# Altium footprint library DM2097_R1M1E1.PcbLib: 70 footprints (part 3 of 5)
Each footprint in its own frame and in the unit in brackets; x right, y up, seen from the top. Pads: shape width x height; smd on the part's side, far side on the other; paste and mask are expansions set on the pad; w line width, h text height; cw(c..) or ccw(c..) is an arc to the next point about the centre after c.
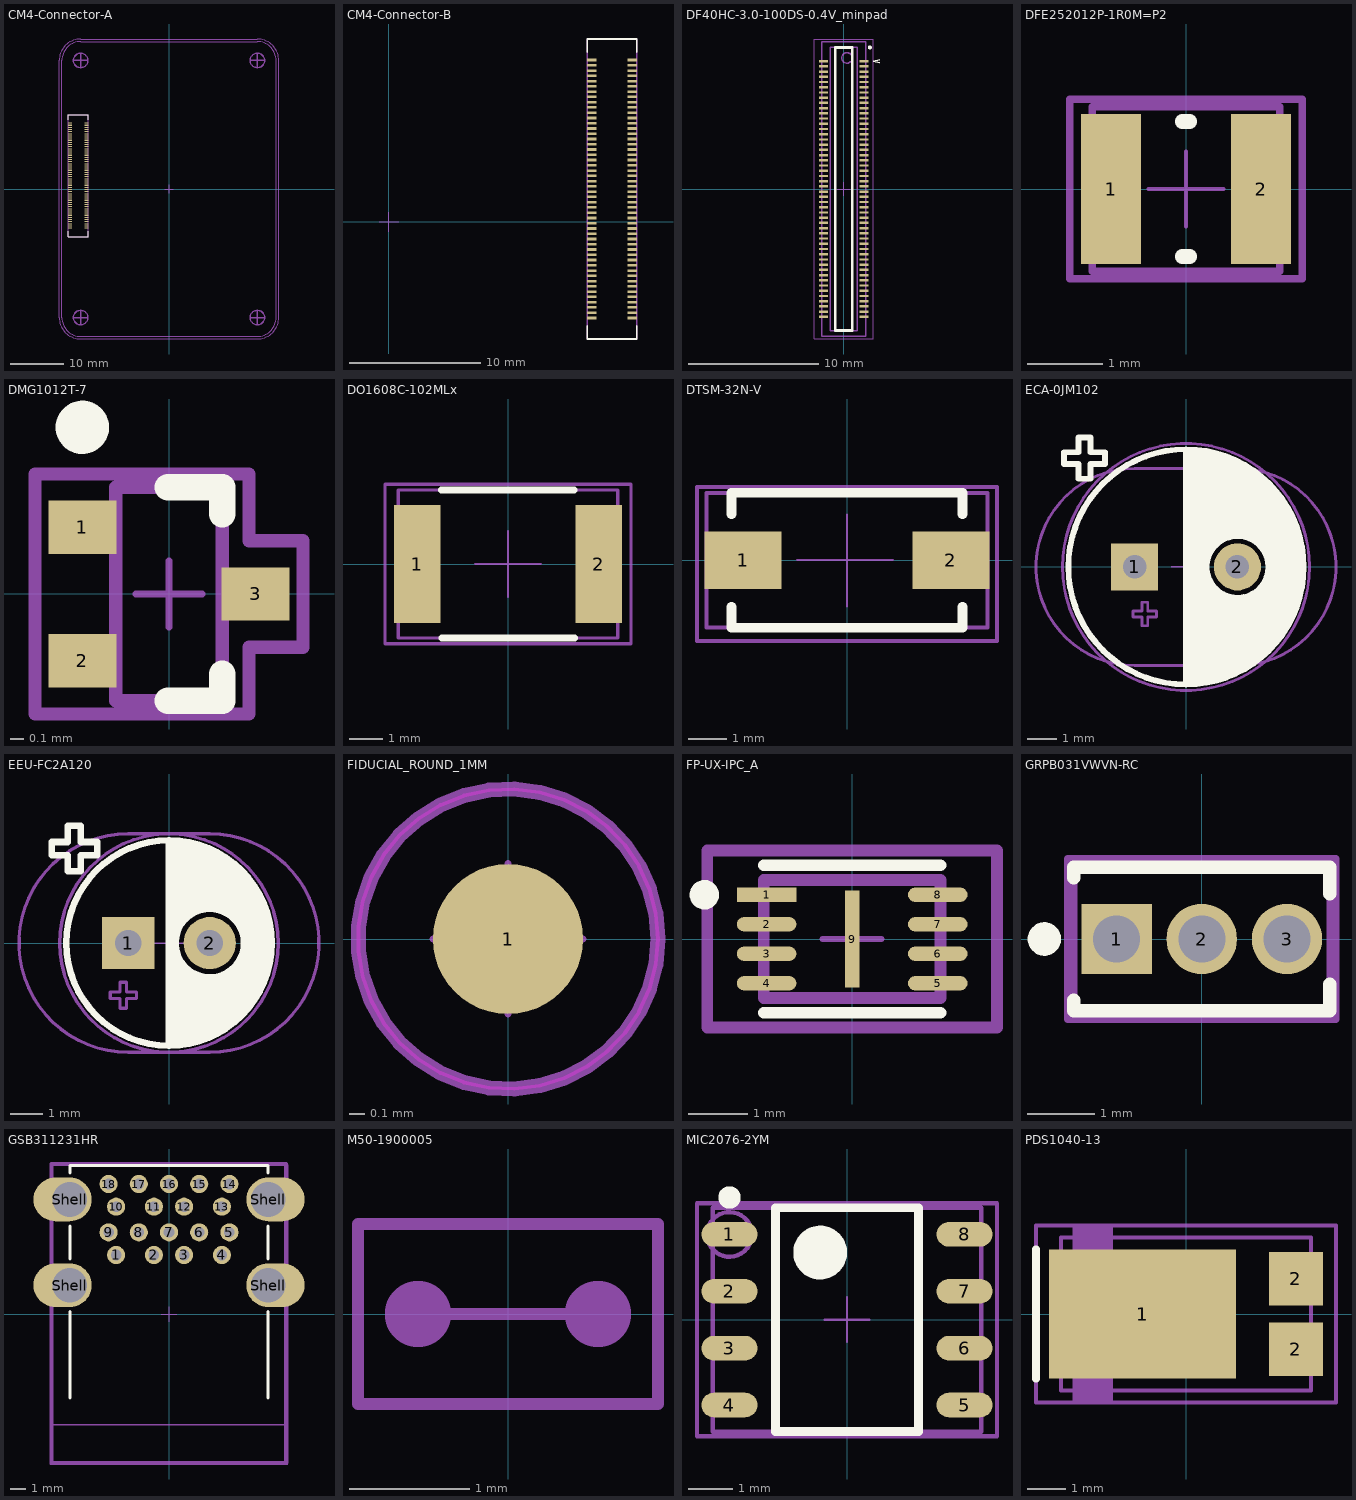
[diagram p2: the footprints below, top view; thin cyan lines are the x and y axes]

## CM4-Connector-A [mm] "DF40HC(3.0)-100DS-0.4v by Amornthep Phunsin"
pads (100):
  rect 0.7x0.2 smd: 1(-15.42,-7.3) 2(-18.5,-7.3) 3(-15.42,-6.9) 4(-18.5,-6.9) 5(-15.42,-6.5) 6(-18.5,-6.5) 7(-15.42,-6.1) 8(-18.5,-6.1) 9(-15.42,-5.7) 10(-18.5,-5.7) 11(-15.42,-5.3) 12(-18.5,-5.3) 13(-15.42,-4.9) 14(-18.5,-4.9) 15(-15.42,-4.5) 16(-18.5,-4.5) 17(-15.42,-4.1) 18(-18.5,-4.1) 19(-15.42,-3.7) 20(-18.5,-3.7) 21(-15.42,-3.3) 22(-18.5,-3.3) 23(-15.42,-2.9) 24(-18.5,-2.9) 25(-15.42,-2.5) 26(-18.5,-2.5) 27(-15.42,-2.1) 28(-18.5,-2.1) 29(-15.42,-1.7) 30(-18.5,-1.7) 31(-15.42,-1.3) 32(-18.5,-1.3) 33(-15.42,-0.9) 34(-18.5,-0.9) 35(-15.42,-0.5) 36(-18.5,-0.5) 37(-15.42,-0.1) 38(-18.5,-0.1) 39(-15.42,0.3) 40(-18.5,0.3) 41(-15.42,0.7) 42(-18.5,0.7) 43(-15.42,1.1) 44(-18.5,1.1) 45(-15.42,1.5) 46(-18.5,1.5) 47(-15.42,1.9) 48(-18.5,1.9) 49(-15.42,2.3) 50(-18.5,2.3) 51(-15.42,2.7) 52(-18.5,2.7) 53(-15.42,3.1) 54(-18.5,3.1) 55(-15.42,3.5) 56(-18.5,3.5) 57(-15.42,3.9) 58(-18.5,3.9) 59(-15.42,4.3) 60(-18.5,4.3) 61(-15.42,4.7) 62(-18.5,4.7) 63(-15.42,5.1) 64(-18.5,5.1) 65(-15.42,5.5) 66(-18.5,5.5) 67(-15.42,5.9) 68(-18.5,5.9) 69(-15.42,6.3) 70(-18.5,6.3) 71(-15.42,6.7) 72(-18.5,6.7) 73(-15.42,7.1) 74(-18.5,7.1) 75(-15.42,7.5) 76(-18.5,7.5) 77(-15.42,7.9) 78(-18.5,7.9) 79(-15.42,8.3) 80(-18.5,8.3) 81(-15.42,8.7) 82(-18.5,8.7) 83(-15.42,9.1) 84(-18.5,9.1) 85(-15.42,9.5) 86(-18.5,9.5) 87(-15.42,9.9) 88(-18.5,9.9) 89(-15.42,10.3) 90(-18.5,10.3) 91(-15.42,10.7) 92(-18.5,10.7) 93(-15.42,11.1) 94(-18.5,11.1) 95(-15.42,11.5) 96(-18.5,11.5) 97(-15.42,11.9) 98(-18.5,11.9) 99(-15.42,12.3) 100(-18.5,12.3)
Top Overlay:
  lines w0.12: -18.85,-7.9 -18.85,-8.9 -15.07,-8.9 -15.07,-7.9 ; -18.85,12.9 -18.85,13.9 -15.07,13.9 -15.07,12.9
Top Assembly:
  lines w0.12: -20,-24 ccw(c-16.5,-24) -16.5,-27.5 16.5,-27.5 ccw(c16.5,-24) 20,-24 20,24 ccw(c16.5,24) 16.5,27.5 -16.5,27.5 ccw(c-16.5,24) -20,24 -20,-24 ; -18.85,-8.9 -18.85,13.9 -15.07,13.9 -15.07,-8.9 -18.85,-8.9
  text "'.Designator'" at -17.3,3.7 h1
  text "Raspberry Pi Compute Module 4" at 1.787,14.946 h1
Top Courtyard:
  lines w0.05: -0.75,0 0,0 ; 0,-0.75 0,0 ; 0,0.75 0,0 ; 0.75,0 0,0
  lines w0.12: -20.5,-24 ccw(c-16.5,-24) -16.5,-28 16.5,-28 ccw(c16.5,-24) 20.5,-24 20.5,24 ccw(c16.5,24) 16.5,28 -16.5,28 ccw(c-16.5,24) -20.5,24 -20.5,-24 ; -18.85,-8.9 -18.85,13.9 -15.07,13.9 -15.07,-8.9 -18.85,-8.9
Bottom Courtyard:
  lines w0.05: -17,24 -16,24 ; -16.5,23.5 -16.5,24.5 ; 16,-24 17,-24 ; 16.5,-24.5 16.5,-23.5
Top Component Outline:
  circle w0.254: c16.5,24 r1.35
  circle w0.254: c-16.5,-24 r1.35
  circle w0.254: c16.5,-24 r1.35
  circle w0.254: c-16.5,24 r1.35
  lines w0.12: -20,-24 ccw(c-16.5,-24) -16.5,-27.5 16.5,-27.5 ccw(c16.5,-24) 20,-24 20,24 ccw(c16.5,24) 16.5,27.5 -16.5,27.5 ccw(c-16.5,24) -20,24 -20,-24
  lines w0.254: -17.85,-24 -15.15,-24 ; -17.85,24 -15.15,24 ; -16.5,-25.35 -16.5,-22.65 ; -16.5,22.65 -16.5,25.35 ; 15.15,-24 17.85,-24 ; 15.15,24 17.85,24 ; 16.5,-25.35 16.5,-22.65 ; 16.5,22.65 16.5,25.35
3D body "DF40HC(3.0)-100DS-0.4V.stp": height 2.9, standoff 0, extent -18.69,-8.785 -15.31,13.815

## CM4-Connector-B [mm] "DF40HC(3.0)-100DS-0.4v by Amornthep Phunsin"
pads (100):
  rect 0.7x0.2 smd: 1(18.5,-7.3) 2(15.42,-7.3) 3(18.5,-6.9) 4(15.42,-6.9) 5(18.5,-6.5) 6(15.42,-6.5) 7(18.5,-6.1) 8(15.42,-6.1) 9(18.5,-5.7) 10(15.42,-5.7) 11(18.5,-5.3) 12(15.42,-5.3) 13(18.5,-4.9) 14(15.42,-4.9) 15(18.5,-4.5) 16(15.42,-4.5) 17(18.5,-4.1) 18(15.42,-4.1) 19(18.5,-3.7) 20(15.42,-3.7) 21(18.5,-3.3) 22(15.42,-3.3) 23(18.5,-2.9) 24(15.42,-2.9) 25(18.5,-2.5) 26(15.42,-2.5) 27(18.5,-2.1) 28(15.42,-2.1) 29(18.5,-1.7) 30(15.42,-1.7) 31(18.5,-1.3) 32(15.42,-1.3) 33(18.5,-0.9) 34(15.42,-0.9) 35(18.5,-0.5) 36(15.42,-0.5) 37(18.5,-0.1) 38(15.42,-0.1) 39(18.5,0.3) 40(15.42,0.3) 41(18.5,0.7) 42(15.42,0.7) 43(18.5,1.1) 44(15.42,1.1) 45(18.5,1.5) 46(15.42,1.5) 47(18.5,1.9) 48(15.42,1.9) 49(18.5,2.3) 50(15.42,2.3) 51(18.5,2.7) 52(15.42,2.7) 53(18.5,3.1) 54(15.42,3.1) 55(18.5,3.5) 56(15.42,3.5) 57(18.5,3.9) 58(15.42,3.9) 59(18.5,4.3) 60(15.42,4.3) 61(18.5,4.7) 62(15.42,4.7) 63(18.5,5.1) 64(15.42,5.1) 65(18.5,5.5) 66(15.42,5.5) 67(18.5,5.9) 68(15.42,5.9) 69(18.5,6.3) 70(15.42,6.3) 71(18.5,6.7) 72(15.42,6.7) 73(18.5,7.1) 74(15.42,7.1) 75(18.5,7.5) 76(15.42,7.5) 77(18.5,7.9) 78(15.42,7.9) 79(18.5,8.3) 80(15.42,8.3) 81(18.5,8.7) 82(15.42,8.7) 83(18.5,9.1) 84(15.42,9.1) 85(18.5,9.5) 86(15.42,9.5) 87(18.5,9.9) 88(15.42,9.9) 89(18.5,10.3) 90(15.42,10.3) 91(18.5,10.7) 92(15.42,10.7) 93(18.5,11.1) 94(15.42,11.1) 95(18.5,11.5) 96(15.42,11.5) 97(18.5,11.9) 98(15.42,11.9) 99(18.5,12.3) 100(15.42,12.3)
Top Overlay:
  lines w0.12: 15.07,-7.9 15.07,-8.9 18.85,-8.9 18.85,-7.9 ; 15.07,12.9 15.07,13.9 18.85,13.9 18.85,12.9
Top Assembly:
  lines w0.12: 15.07,-8.9 18.85,-8.9 18.85,13.9 15.07,13.9 15.07,-8.9
  text "'.Designator'" at 16.8,4.5 h1
Top Courtyard:
  lines w0.05: -0.75,0 0,0 ; 0,-0.75 0,0 ; 0,0.75 0,0 ; 0.75,0 0,0
  lines w0.12: 15.07,-8.9 18.85,-8.9 18.85,13.9 15.07,13.9 15.07,-8.9
3D body "DF40HC(3.0)-100DS-0.4V.stp": height 2.9, standoff 0, extent 15.31,-8.785 18.69,13.815

## DF40HC-3.0-100DS-0.4V_minpad [mm] "3.0MM MATED HEIGHT CONN HDR 100POS 0.4MM SMD GOLD"
height 2.9
pads (100):
  rect 0.7x0.18 smd: 1(1.54,9.8) 2(-1.54,9.8) 3(1.54,9.4) 4(-1.54,9.4) 5(1.54,9) 6(-1.54,9) 7(1.54,8.6) 8(-1.54,8.6) 9(1.54,8.2) 10(-1.54,8.2) 11(1.54,7.8) 12(-1.54,7.8) 13(1.54,7.4) 14(-1.54,7.4) 15(1.54,7) 16(-1.54,7) 17(1.54,6.6) 18(-1.54,6.6) 19(1.54,6.2) 20(-1.54,6.2) 21(1.54,5.8) 22(-1.54,5.8) 23(1.54,5.4) 24(-1.54,5.4) 25(1.54,5) 26(-1.54,5) 27(1.54,4.6) 28(-1.54,4.6) 29(1.54,4.2) 30(-1.54,4.2) 31(1.54,3.8) 32(-1.54,3.8) 33(1.54,3.4) 34(-1.54,3.4) 35(1.54,3) 36(-1.54,3) 37(1.54,2.6) 38(-1.54,2.6) 39(1.54,2.2) 40(-1.54,2.2) 41(1.54,1.8) 42(-1.54,1.8) 43(1.54,1.4) 44(-1.54,1.4) 45(1.54,1) 46(-1.54,1) 47(1.54,0.6) 48(-1.54,0.6) 49(1.54,0.2) 50(-1.54,0.2) 51(1.54,-0.2) 52(-1.54,-0.2) 53(1.54,-0.6) 54(-1.54,-0.6) 55(1.54,-1) 56(-1.54,-1) 57(1.54,-1.4) 58(-1.54,-1.4) 59(1.54,-1.8) 60(-1.54,-1.8) 61(1.54,-2.2) 62(-1.54,-2.2) 63(1.54,-2.6) 64(-1.54,-2.6) 65(1.54,-3) 66(-1.54,-3) 67(1.54,-3.4) 68(-1.54,-3.4) 69(1.54,-3.8) 70(-1.54,-3.8) 71(1.54,-4.2) 72(-1.54,-4.2) 73(1.54,-4.6) 74(-1.54,-4.6) 75(1.54,-5) 76(-1.54,-5) 77(1.54,-5.4) 78(-1.54,-5.4) 79(1.54,-5.8) 80(-1.54,-5.8) 81(1.54,-6.2) 82(-1.54,-6.2) 83(1.54,-6.6) 84(-1.54,-6.6) 85(1.54,-7) 86(-1.54,-7) 87(1.54,-7.4) 88(-1.54,-7.4) 89(1.54,-7.8) 90(-1.54,-7.8) 91(1.54,-8.2) 92(-1.54,-8.2) 93(1.54,-8.6) 94(-1.54,-8.6) 95(1.54,-9) 96(-1.54,-9) 97(1.54,-9.4) 98(-1.54,-9.4) 99(1.54,-9.8) 100(-1.54,-9.8)
Top Overlay:
  circle w0.254: c2,10.85 r0.025
  lines w0.102: 2.75,9.685 2.25,9.8 2.75,9.915
  lines w0.2: -0.65,-10.85 -0.65,10.85 0.65,10.85 0.65,-10.85 -0.65,-10.85
Top Assembly:
  circle w0.1: c0.25,10.05 r0.4
  lines w0.1: -1.05,-10.85 -1.05,10.85 1.05,10.85 1.05,-10.85 -1.05,-10.85
  text "'.Designator'" at -0.4,0.776 h1
Top Courtyard:
  lines w0.05: -0.5,0 0.5,0 ; 0,-0.5 0,0.5 ; -2.25,-11.5 2.25,-11.5 2.25,11.5 -2.25,11.5 -2.25,-11.5
Top Component Outline:
  lines w0.1: -1.69,-11.305 1.69,-11.305 1.69,11.295 -1.69,11.295 -1.69,-11.305
3D body "DF40HC(3.0)-100DS-0.4V.stp": height 2.85, standoff -0.05, extent -1.69,-11.305 1.69,11.295

## DFE252012P-1R0M=P2 [mm] "Chip Inductor, 2-Leads, Body 2.40x2.00mm, IPC High Density"
height 1.2
pads (2):
  rect 0.8x2 smd: 1(-1,0) 2(1,0)
Top Overlay:
  lines w0.2: -0.05,-0.9 0.05,-0.9 ; -0.05,0.9 0.05,0.9
Top Assembly:
  lines w0.1: -1.55,-1.2 1.55,-1.2 1.55,1.2 -1.55,1.2 -1.55,-1.2
  text "'.Designator'" at 0,0 h1
Top Courtyard:
  lines w0.05: -0.5,0 0.5,0 ; 0,-0.5 0,0.5 ; -1.55,-1.2 1.55,-1.2 1.55,1.2 -1.55,1.2 -1.55,-1.2
Top Component Outline:
  lines w0.1: -1.25,-1.1 -1.25,1.1 1.25,1.1 1.25,-1.1 -1.25,-1.1
3D body: height 1.2, standoff 0, extent 0.65,-1.1 1.25,1.1
3D body: height 1.2, standoff 0, extent -1.25,-1.1 -0.65,1.1
3D body: height 1.2, standoff 0, extent -0.65,-1.1 0.65,1.1

## DMG1012T-7 [mm] "SOT523, 3-Leads, Body 1.6x0.8mm, Pitch 0.50mm"
height 0.862
pads (3):
  rect 0.51x0.4 smd: 1(-0.65,0.5) 2(-0.65,-0.5) 3(0.65,0)
Top Overlay:
  circle w0.2: c-0.65,1.25 r0.1
  lines w0.2: -0.008,-0.8 0.4,-0.8 0.4,-0.6 ; -0.008,0.8 0.4,0.8 0.4,0.6
Top Assembly:
  lines w0.1: -1.005,-0.9 -1.005,0.9 0.6,0.9 0.6,0.4 1.005,0.4 1.005,-0.4 0.6,-0.4 0.6,-0.9 -1.005,-0.9
  text "'.Designator'" at 0,0 h1
Top Courtyard:
  lines w0.05: -0.25,0 0.25,0 ; 0,-0.25 0,0.25 ; -1.005,-0.9 -1.005,0.9 0.6,0.9 0.6,0.4 1.005,0.4 1.005,-0.4 0.6,-0.4 0.6,-0.9 -1.005,-0.9
Top Component Outline:
  lines w0.1: -0.4,-0.8 -0.4,0.8 0.4,0.8 0.4,-0.8 -0.4,-0.8
3D body: height 0.86, standoff 0, extent -0.4,-0.8 0.4,0.8

## DO1608C-102MLx [mm] "Coil inductor 6.6x4.45mm"
height 2.92
pads (2):
  rect 1.4x3.56 smd: 1(-2.73,0) 2(2.73,0)
Top Overlay:
  lines w0.2: -2.007,2.225 1.993,2.225 ; -1.993,-2.225 2.007,-2.225
Top Assembly:
  lines w0.1: -3.7,-2.4 3.7,-2.4 3.7,2.4 -3.7,2.4 -3.7,-2.4
  text "'.Designator'" at 0,0 h1
Top Courtyard:
  lines w0.05: -1,0 0,0 ; 0,-1 0,0 ; 0,1 0,0 ; 1,0 0,0 ; -3.7,-2.4 3.7,-2.4 3.7,2.4 -3.7,2.4 -3.7,-2.4
Top Component Outline:
  lines w0.1: -3.3,-2.225 3.3,-2.225 3.3,2.225 -3.3,2.225 -3.3,-2.225
3D body "Coilcraft-DO1608C.STEP": height 2.92, standoff -0.01, extent -3.3,-2.225 3.3,2.225

## DTSM-32N-V [mm] "tactile button 160gf"
height 5
pads (2):
  rect 2x1.5 smd: 1(-2.7,0) 2(2.7,0)
Top Overlay:
  lines w0.254: -3.005,-1.209 -3,-1.759 3,-1.759 3,-1.209 ; -3.005,1.75 -3,1.191 ; -3,1.75 3,1.75 3,1.191
Top Assembly:
  lines w0.1: -3.9,-2.1 3.9,-2.1 3.9,1.9 -3.9,1.9 -3.9,-2.1
  text "'.Designator'" at 0,0 h1
Top Courtyard:
  lines w0.05: -1.3,0 0,0 ; 0,-1.209 0,0 ; 0,1.191 0,0 ; 1.2,0 0,0 ; -3.9,-2.1 3.9,-2.1 3.9,1.9 -3.9,1.9 -3.9,-2.1
Top Component Outline:
  lines w0.1: -3.65,-1.75 3.65,-1.75 3.65,1.75 -3.65,1.75 -3.65,-1.75
3D body "4341x3.stp": height 5, standoff 0, extent -3.65,-1.75 3.65,1.75

## ECA-0JM102 [mm] "Body diameter: 8mm, lead pitch: 3.5mm"
height 16
pads (2):
  rect 1.6x1.6 / inner round 1.6 / far side rect 1.6x1.6 hole 0.8 mask+0.05: 1(-1.75,0)
  round 1.6 hole 0.8 mask+0.05: 2(1.75,0)
Top Overlay:
  circle w0.2: c0,0 r4
  circle w0.1: c1.75,0 r1
  region: 0,4 0,0 0.75,0 0.762,0.104 0.816,0.305 0.909,0.492 1.036,0.658 1.193,0.795 1.373,0.899 1.571,0.966 1.778,0.993 1.882,0.991 1.973,0.977 2.147,0.923 2.308,0.835 2.449,0.718 2.51,0.65 2.567,0.582 2.66,0.431 2.721,0.264 2.749,0.089 2.75,0 4,0 4,0.262 3.932,0.782 3.796,1.289 3.595,1.773 3.333,2.227 3.014,2.643 2.643,3.014 2.227,3.333 1.773,3.595 1.289,3.796 0.782,3.932 0.262,4
  region: 0,-4 0,0 0.75,0 0.759,-0.131 0.826,-0.383 0.957,-0.609 1.141,-0.793 1.367,-0.924 1.619,-0.991 1.881,-0.991 2.133,-0.924 2.359,-0.793 2.543,-0.609 2.674,-0.383 2.741,-0.131 2.75,0 4,0 4,-0.262 3.932,-0.782 3.796,-1.289 3.595,-1.773 3.333,-2.227 3.014,-2.643 2.643,-3.014 2.227,-3.333 1.773,-3.595 1.289,-3.796 0.782,-3.932 0.262,-4
  lines w0.2: -4.15,3.5 -3.65,3.5 -3.65,3 -3.25,3 -3.25,3.5 -2.75,3.5 -2.75,3.9 -3.25,3.9 -3.25,4.4 -3.65,4.4 -3.65,3.9 -4.15,3.9 -4.15,3.5
  lines w0.203: 0,-4 0,4
Top Assembly:
  circle w0.1: c0,0 r4.2
  lines w0.1: -1.8,-1.7 -1.5,-1.7 -1.5,-2 -1.3,-2 -1.3,-1.7 -1,-1.7 -1,-1.5 -1.3,-1.5 -1.3,-1.2 -1.5,-1.2 -1.5,-1.5 -1.8,-1.5 -1.8,-1.7 ; 1,-1.7 1.8,-1.7 1.8,-1.5 1,-1.5 1,-1.7
  text "'.Designator'" at 0,0 h1
Top Courtyard:
  circle w0.05: c0,0 r4.2
  lines w0.05: -0.5,0 0.5,0 ; 0,-0.5 0,0.5
Bottom Courtyard:
  lines w0.1: -1.75,-3.35 cw(c-1.75,0) -1.75,3.35 1.75,3.35 cw(c1.75,0) 1.75,-3.35 -1.75,-3.35
Top Component Outline:
  circle w0.1: c0,0 r4
3D body "EC 8x15 P3.5 D0.6.STEP": height 16, standoff -0.8, extent -4,-4 4,4

## EEU-FC2A120 [mm] "Body diameter: 6.3mm, lead pitch: 2.5mm"
height 12.2
pads (2):
  rect 1.6x1.6 / inner round 1.6 / far side rect 1.6x1.6 hole 0.8 mask+0.05: 1(-1.25,0)
  round 1.6 hole 0.8 mask+0.05: 2(1.25,0)
Top Overlay:
  circle w0.1: c1.25,0 r1
  circle w0.2: c0,0 r3.15
  region: 0,-3.15 0,0 0.25,0 0.259,-0.131 0.326,-0.383 0.457,-0.609 0.641,-0.793 0.867,-0.924 1.119,-0.991 1.381,-0.991 1.633,-0.924 1.859,-0.793 2.043,-0.609 2.174,-0.383 2.241,-0.131 2.25,0 3.15,0 3.15,-0.206 3.096,-0.616 2.989,-1.015 2.831,-1.396 2.625,-1.754 2.373,-2.081 2.081,-2.373 1.754,-2.625 1.396,-2.831 1.015,-2.989 0.616,-3.096 0.206,-3.15
  region: 0,3.15 0,0 0.25,0 0.259,0.131 0.326,0.383 0.457,0.609 0.641,0.793 0.867,0.924 1.119,0.991 1.381,0.991 1.633,0.924 1.859,0.793 2.043,0.609 2.174,0.383 2.241,0.131 2.25,0 3.15,0 3.15,0.206 3.096,0.616 2.989,1.015 2.831,1.396 2.625,1.754 2.373,2.081 2.081,2.373 1.754,2.625 1.396,2.831 1.015,2.989 0.616,3.096 0.206,3.15
  lines w0.2: -3.6,2.7 -3.6,3.1 -3.1,3.1 -3.1,3.6 -2.7,3.6 -2.7,3.1 -2.2,3.1 -2.2,2.7 -2.7,2.7 -2.7,2.2 -3.1,2.2 -3.1,2.7 -3.6,2.7
  lines w0.203: 0,-3.15 0,3.15
Top Assembly:
  circle w0.1: c0,0 r3.35
  lines w0.1: -1.8,-1.7 -1.8,-1.5 -1.5,-1.5 -1.5,-1.2 -1.3,-1.2 -1.3,-1.5 -1,-1.5 -1,-1.7 -1.3,-1.7 -1.3,-2 -1.5,-2 -1.5,-1.7 -1.8,-1.7 ; 1,-1.7 1,-1.5 1.8,-1.5 1.8,-1.7 1,-1.7
  text "'.Designator'" at 0,0 h1
Top Courtyard:
  circle w0.05: c0,0 r3.35
  lines w0.05: -0.5,0 0.5,0 ; 0,-0.5 0,0.5
Bottom Courtyard:
  lines w0.1: -1.25,-3.35 cw(c-1.25,0) -1.25,3.35 1.25,3.35 cw(c1.25,0) 1.25,-3.35 -1.25,-3.35
Top Component Outline:
  circle w0.1: c0,0 r3.15
3D body "EC 6.3x11 P2.5 D0.5.STEP": height 12, standoff -0.8, extent -3.15,-3.15 3.15,3.15

## FIDUCIAL_ROUND_1MM [mm] "Round, 1mm dia"
pads (1):
  round 1 smd paste-1 mask+0.5: 1(0,0)
Top Layer keep-out:
  circle w0.025: c0,0 r1
Top Assembly:
  circle w0.1: c0,0 r1
  text "'.Designator'" at 0,0 h0.75
Top Courtyard:
  circle w0.05: c0,0 r1
  lines w0.05: -0.5,0 0.5,0 ; 0,-0.5 0,0.5

## FP-UX-IPC_A [mm]
pads (9):
  rect 1.011x0.242 smd paste+0 mask+0: 1(-1.451,0.75)
  rrect100% 1.011x0.242 smd paste+0 mask+0: 2(-1.451,0.25) 3(-1.451,-0.25) 4(-1.451,-0.75) 5(1.451,-0.75) 6(1.451,-0.25) 7(1.451,0.25) 8(1.451,0.75)
  rect 0.25x1.65 smd paste-1000 mask+0: 9(0,0)
Top Overlay:
  circle w0.25: c-2.506,0.75 r0.125
  lines w0.2: -1.5,-1.25 1.5,-1.25 ; -1.5,1.25 1.5,1.25
Top Paste:
  rectangle: -0.055,-0.755 0.055,0.755
Top Assembly:
  lines w0.2: -2.456,-1.5 -2.456,1.5 2.456,1.5 2.456,-1.5 -2.456,-1.5
  text ".Designator" at 0,0 h1
Top Courtyard:
  lines w0.1: -0.5,0 0.5,0 ; 0,-0.5 0,0.5
  lines w0.2: -2.456,-1.5 -2.456,1.5 2.456,1.5 2.456,-1.5 -2.456,-1.5
Top Component Outline:
  lines w0.2: -1.5,-1 1.5,-1 1.5,1 -1.5,1 -1.5,-1
3D body "IC_Winbond_W25Q80DVUXIE_TR_eec.STEP": height 0.25, standoff 0, extent -2.456,-1.5 2.456,1.5

## GRPB031VWVN-RC [mm] "Header, 3-Leads, Body 3.81x2.14mm, Pitch 1.27mm (SLIN-GRPB031VWVN-RC_V)"
height 4
pads (3):
  rect 1.05x1.05 hole 0.7: 1(-1.27,0)
  round 1.05 hole 0.7: 2(0,0) 3(1.27,0)
Top Overlay:
  circle w0.25: c-2.345,0 r0.125
  lines w0.2: -1.905,-0.91 -1.905,-1.07 1.905,-1.07 1.905,-0.673 ; -1.905,0.91 -1.905,1.07 1.905,1.07 1.905,0.673
Top Assembly:
  circle w0.254: c-2.3,0 r0.025
  lines w0.1: -2,-1.2 2,-1.2 2,1.2 -2,1.2 -2,-1.2
  text "'.Designator'" at 0,0 h1
Top Courtyard:
  lines w0.05: -0.5,0 0.5,0 ; 0,-0.5 0,0.5 ; -2.005,-1.2 -2.005,1.2 2,1.2 2,-1.2 -2.005,-1.2
Top Component Outline:
  lines w0.1: -1.905,-1.07 -1.905,1.07 1.905,1.07 1.905,-1.07 -1.905,-1.07
3D body "_ _ _B031VWVN-RC.STEP": height 4, standoff -2.3, extent -1.905,-1.07 1.905,1.07

## GSB311231HR [mm] "USB 3.0 Type A Stacked"
height 15.42
pads (22):
  round 1.2 hole 0.7: 1(-3.5,3.93) 2(-1,3.93) 3(1,3.93) 4(3.5,3.93) 5(4,5.43) 6(2,5.43) 7(0,5.43) 8(-2,5.43) 9(-4,5.43) 10(-3.5,7.13) 11(-1,7.13) 12(1,7.13) 13(3.5,7.13) 14(4,8.63) 15(2,8.63) 16(0,8.63) 17(-2,8.63) 18(-4,8.63)
  oval 3.85x2.9 hole 2.3 copper offset -0.475,0: Shell(-6.57,1.93) Shell(-6.57,7.61)
  oval 3.85x2.9 hole 2.3 copper offset 0.475,0: Shell(6.57,1.93) Shell(6.57,7.61)
Top Overlay:
  lines w0.2: -6.55,-5.55 -6.55,0.2 ; -6.55,3.66 -6.55,5.85 ; -6.55,9.35 -6.55,9.85 6.55,9.85 6.55,9.35 ; 6.55,-5.55 6.55,0.2 ; 6.55,3.66 6.55,5.85
Top Assembly:
  lines w0.1: -7.747,-7.31 7.874,-7.31 ; -7.747,-9.85 -7.747,9.906 7.874,9.906 7.874,-9.85 -7.747,-9.85
  text "'.Designator'" at -2,0 h1
Top Courtyard:
  lines w0.05: -0.5,0 0.5,0 ; 0,-0.5 0,0.5 ; -7.874,-9.906 -7.874,9.906 7.874,9.906 7.874,-9.906 -7.874,-9.906
Top Component Outline:
  lines w0.254: -7.777,-9.85 -7.777,9.954 -1.277,9.954 7.75,9.954 7.75,-9.85 -7.777,-9.85
3D body "692141030100.stp": height 16.13, standoff -3.48, extent -7.794,-9.85 7.792,9.85

## M50-1900005 [mm] "Shunt for 1.27mm headers"
height 3
Top Assembly:
  circle w0.5: c0.75,0 r0.025
  circle w0.5: c-0.75,0 r0.025
  lines w0.1: -0.6,0 0.625,0 ; -1.25,-0.75 -1.25,0.75 1.25,0.75 1.25,-0.75 -1.25,-0.75
  text "'.Designator'" at 0,0 h1
3D body: height 4.5, standoff 1.5, extent -1.25,-0.75 1.25,0.75

## MIC2076-2YM [mm] "SOIC, 8-Leads, Body 5x4mm, Pitch 1.27mm, IPC High Density"
height 1.73
pads (8):
  oval 1.25x0.55 smd: 1(-2.625,1.905) 2(-2.625,0.635) 3(-2.625,-0.635) 4(-2.625,-1.905) 5(2.625,-1.905) 6(2.625,-0.635) 7(2.625,0.635) 8(2.625,1.905)
Top Overlay:
  circle w0.25: c-2.625,2.73 r0.125
  circle w0.6: c-0.6,1.5 r0.3
  lines w0.2: -1.6,-2.5 -1.6,2.5 1.6,2.5 1.6,-2.5 -1.6,-2.5
Top Assembly:
  circle w0.1: c-2.625,1.905 r0.5
  lines w0.1: -3.35,-2.6 3.35,-2.6 3.35,2.6 -3.35,2.6 -3.35,-2.6
  text "'.Designator'" at 0,0 h1
Top Courtyard:
  lines w0.05: -0.5,0 0.5,0 ; 0,-0.5 0,0.5 ; -3.35,-2.6 -3.35,2.6 3.35,2.6 3.35,-2.6 -3.35,-2.6
Top Component Outline:
  lines w0.1: -2.995,-2.5 -2.995,2.5 2.995,2.5 2.995,-2.5 -2.995,-2.5
3D body "SOIC127P600X173-8L.step": height 1.73, standoff 0, extent -2.995,-2.5 2.995,2.5

## PDS1040-13 [mm] "Powerdi5 Diodes"
height 1.15
pads (3):
  rect 4.86x3.36 smd: 1(-1.126,0)
  rect 1.4x1.39 smd: 2(2.856,-0.92) 2(2.856,0.92)
Top Overlay:
  lines w0.2: -3.9,-1.68 -3.9,1.68
Top Assembly:
  region: -1.91,-2.296 -1.91,2.304 -2.939,2.304 -2.939,-2.296
  lines w0.1: -3.9,-2.3 3.9,-2.3 3.9,2.3 -3.9,2.3 -3.9,-2.3
  text "'.Designator'" at 0,0 h1
Top Courtyard:
  lines w0.05: -0.5,0 0.5,0 ; 0,-0.5 0,0.5 ; -3.9,-2.3 -3.9,2.3 3.9,2.3 3.9,-2.3 -3.9,-2.3
Top Component Outline:
  lines w0.1: -3.254,1.985 3.254,1.985 3.254,-1.985 -3.254,-1.985 -3.254,1.985 ; -3.254,1.985 -3.254,1.985
3D body "PowerDI5.stp": height 1.12, standoff 0.02, extent -3.254,-1.985 3.254,1.985